# Altium footprint library 2.54MM_母座.PcbLib: 39 footprints (part 3 of 3)
Each footprint in its own frame and in the unit in brackets; x right, y up, seen from the top. Pads: shape width x height; smd on the part's side, far side on the other; paste and mask are expansions set on the pad; w line width, h text height; cw(c..) or ccw(c..) is an arc to the next point about the centre after c.
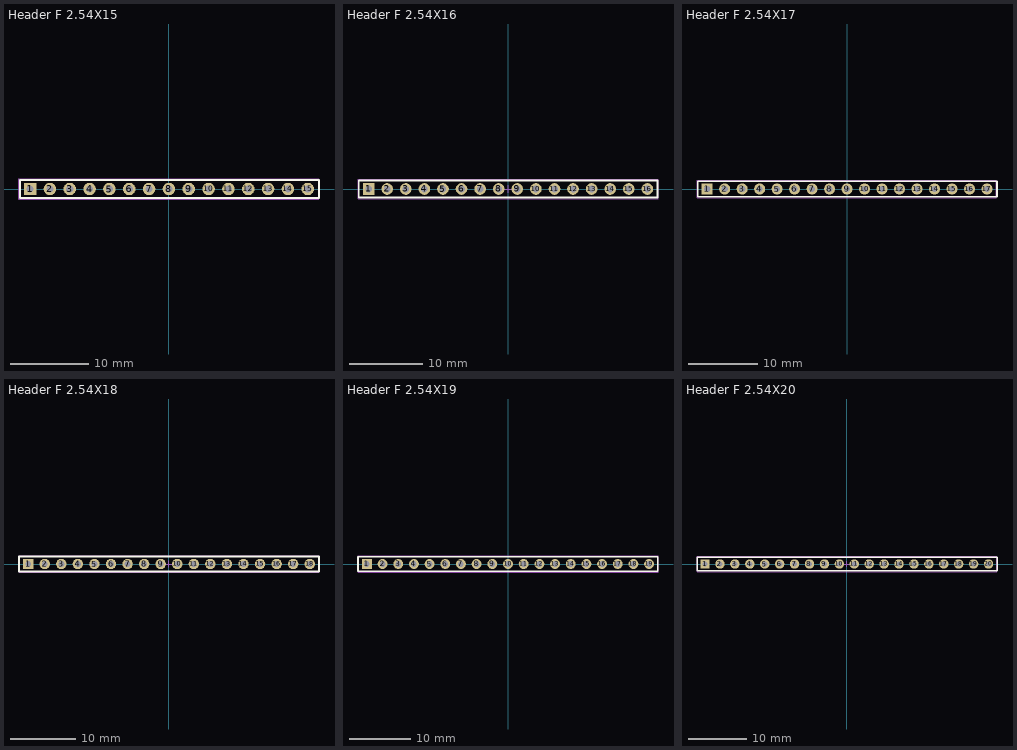
[diagram p2: the footprints below, top view; thin cyan lines are the x and y axes]

## Header F 2.54X15 [mm]
pads (15):
  rect 1.6x1.6 hole 0.9: 1(-17.78,0)
  round 1.6 hole 0.9: 2(-15.24,0) 3(-12.7,0) 4(-10.16,0) 5(-7.62,0) 6(-5.08,0) 7(-2.54,0) 8(0,0) 9(2.54,0) 10(5.08,0) 11(7.62,0) 12(10.16,0) 13(12.7,0) 14(15.24,0) 15(17.78,0)
Top Overlay:
  lines w0.254: -19.1,-1.143 -19.1,1.143 19.22,1.143 19.22,-1.143 -19.1,-1.143
Mechanical 15:
  lines w0.1: -19.2,-1.3 -19.2,1.3 19.2,1.3 19.2,-1.3 -19.2,-1.3
3D body "Header-F-2.54X15.stp": height 8.6, standoff -3.1, extent -19.175,-1.26 19.175,1.24

## Header F 2.54X16 [mm]
pads (16):
  rect 1.6x1.6 hole 0.9: 1(-19.05,0)
  round 1.6 hole 0.9: 2(-16.51,0) 3(-13.97,0) 4(-11.43,0) 5(-8.89,0) 6(-6.35,0) 7(-3.81,0) 8(-1.27,0) 9(1.27,0) 10(3.81,0) 11(6.35,0) 12(8.89,0) 13(11.43,0) 14(13.97,0) 15(16.51,0) 16(19.05,0)
Top Overlay:
  lines w0.254: -20.4,-1.143 20.45,-1.143 20.45,1.143 -20.4,1.143 -20.4,-1.143
Mechanical 15:
  lines w0.1: -0.5,0 0.5,0 ; 0,-0.5 0,0.5 ; -20.5,-1.3 20.5,-1.3 20.5,1.3 -20.5,1.3 -20.5,-1.3
3D body "Header-F-2.54X16.stp": height 8.6, standoff -3.1, extent -20.445,-1.25 20.445,1.25

## Header F 2.54X17 [mm]
pads (17):
  rect 1.6x1.6 hole 0.9: 1(-20.32,0)
  round 1.6 hole 0.9: 2(-17.78,0) 3(-15.24,0) 4(-12.7,0) 5(-10.16,0) 6(-7.62,0) 7(-5.08,0) 8(-2.54,0) 9(0,0) 10(2.54,0) 11(5.08,0) 12(7.62,0) 13(10.16,0) 14(12.7,0) 15(15.24,0) 16(17.78,0) 17(20.32,0)
Top Overlay:
  lines w0.254: -21.7,-1.143 -21.7,1.143 21.78,1.143 21.78,-1.143 -21.7,-1.143
Mechanical 15:
  lines w0.1: -21.8,-1.3 -21.8,1.3 21.7,1.3 21.7,-1.3 -21.8,-1.3
3D body "Header-F-2.54X17.stp": height 8.6, standoff -3.1, extent -21.715,-1.26 21.715,1.24

## Header F 2.54X18 [mm]
pads (18):
  rect 1.6x1.6 hole 0.9: 1(-21.59,0)
  round 1.6 hole 0.9: 2(-19.05,0) 3(-16.51,0) 4(-13.97,0) 5(-11.43,0) 6(-8.89,0) 7(-6.35,0) 8(-3.81,0) 9(-1.27,0) 10(1.27,0) 11(3.81,0) 12(6.35,0) 13(8.89,0) 14(11.43,0) 15(13.97,0) 16(16.51,0) 17(19.05,0) 18(21.59,0)
Top Overlay:
  lines w0.254: -23,-1.143 23.01,-1.143 23.01,1.143 -23,1.143 -23,-1.143
Mechanical 15:
  lines w0.1: -0.5,0 0.5,0 ; 0,-0.5 0,0.5 ; -23,-1.3 23,-1.3 23,1.3 -23,1.3 -23,-1.3
3D body "Header-F-2.54X18.stp": height 8.6, standoff -3.1, extent -22.98,-1.25 22.99,1.25

## Header F 2.54X19 [mm]
pads (19):
  rect 1.6x1.6 hole 0.9: 1(-22.86,0)
  round 1.6 hole 0.9: 2(-20.32,0) 3(-17.78,0) 4(-15.24,0) 5(-12.7,0) 6(-10.16,0) 7(-7.62,0) 8(-5.08,0) 9(-2.54,0) 10(0,0) 11(2.54,0) 12(5.08,0) 13(7.62,0) 14(10.16,0) 15(12.7,0) 16(15.24,0) 17(17.78,0) 18(20.32,0) 19(22.86,0)
Top Overlay:
  lines w0.254: -24.3,-1.143 -24.3,1.143 24.24,1.143 24.24,-1.143 -24.3,-1.143
Mechanical 15:
  lines w0.1: -24.3,-1.3 -24.3,1.3 24.3,1.3 24.3,-1.3 -24.3,-1.3
3D body "Header-F-2.54X19.stp": height 8.6, standoff -3.1, extent -24.26,-1.25 24.25,1.25

## Header F 2.54X20 [mm]
pads (20):
  rect 1.6x1.6 hole 0.9: 1(-24.13,0)
  round 1.6 hole 0.9: 2(-21.59,0) 3(-19.05,0) 4(-16.51,0) 5(-13.97,0) 6(-11.43,0) 7(-8.89,0) 8(-6.35,0) 9(-3.81,0) 10(-1.27,0) 11(1.27,0) 12(3.81,0) 13(6.35,0) 14(8.89,0) 15(11.43,0) 16(13.97,0) 17(16.51,0) 18(19.05,0) 19(21.59,0) 20(24.13,0)
Top Overlay:
  lines w0.254: -25.5,-1.143 25.57,-1.143 25.57,1.143 -25.5,1.143 -25.5,-1.143
Mechanical 15:
  lines w0.1: -0.5,0 0.5,0 ; 0,-0.5 0,0.5 ; -25.5,-1.3 25.5,-1.3 25.5,1.3 -25.5,1.3 -25.5,-1.3
3D body "Header-F-2.54X20.stp": height 8.6, standoff -3.1, extent -25.53,-1.26 25.52,1.24

## PCBComponent_1 [mm]